# Altium footprint library IntLib.PcbLib: 221 footprints (part 13 of 14)
Each footprint in its own frame and in the unit in brackets; x right, y up, seen from the top. Pads: shape width x height; smd on the part's side, far side on the other; paste and mask are expansions set on the pad; w line width, h text height; cw(c..) or ccw(c..) is an arc to the next point about the centre after c.
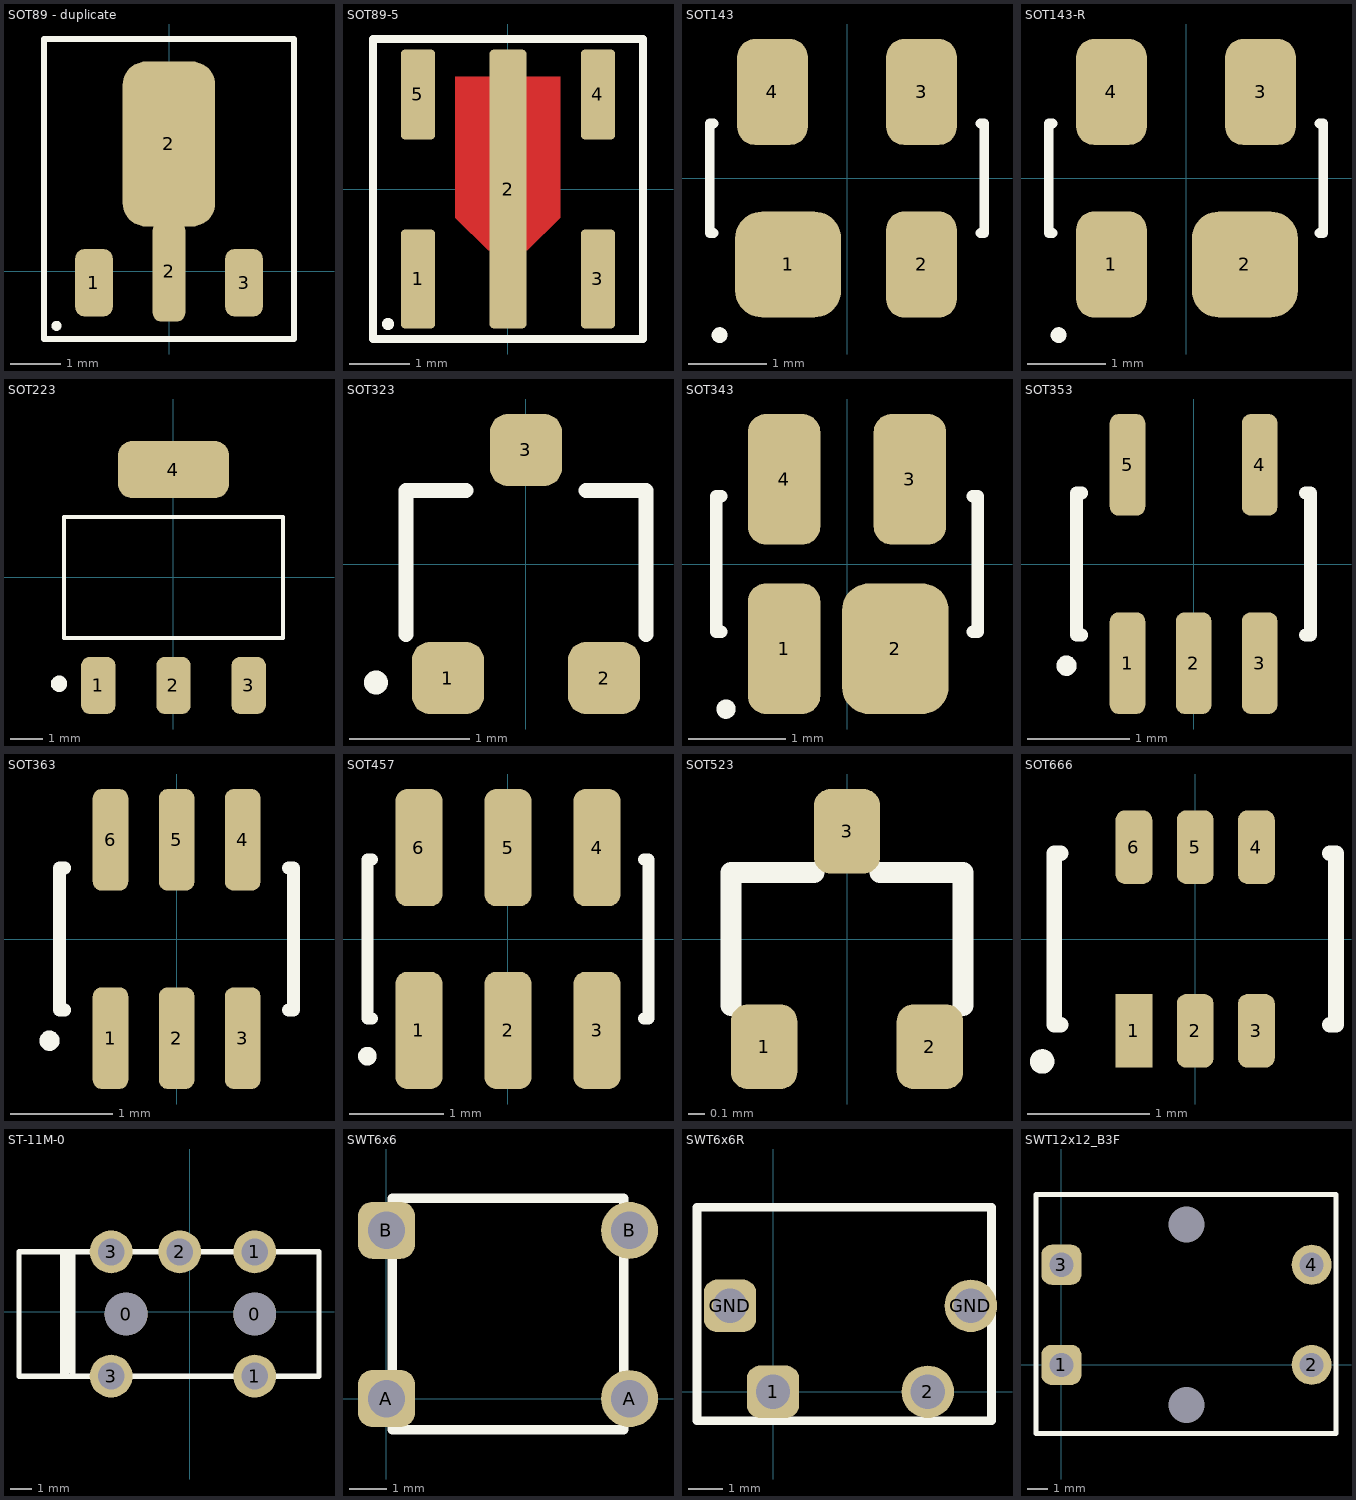
[diagram p12: the footprints below, top view; thin cyan lines are the x and y axes]

## SOT89 - duplicate [mm] "SC-62"
pads (4):
  rrect50% 0.75x1.35 smd: 1(-1.5,-0.225) 3(1.5,-0.225)
  rrect50% 1.85x3.3 smd: 2(0,2.55)
  rrect50% 0.65x2 smd: 2(0,0)
Top Overlay:
  circle w0.1: c-2.25,-1.088 r0.05
  lines w0.127: -2.5,-1.35 2.5,-1.35 2.5,4.65 -2.5,4.65 -2.5,-1.35
3D body: height 1.5, standoff 0, extent -2.25,-0.27 2.25,3.825

## SOT89-5 [mm] "SC-62"
pads (5):
  rrect25% 0.57x1.65 smd: 1(-1.5,-1.5) 3(1.5,-1.5)
  rrect25% 0.62x4.65 smd: 2(0,0)
  rrect25% 0.57x1.5 smd: 4(1.5,1.575) 5(-1.5,1.575)
Top Layer:
  region: -0.325,-1.025 -0.875,-0.475 -0.875,1.875 0.875,1.875 0.875,-0.475 0.325,-1.025
Top Overlay:
  circle w0.1: c-2,-2.25 r0.05
  lines w0.127: -2.25,-2.5 -2.25,2.5 2.25,2.5 2.25,-2.5 -2.25,-2.5
3D body: height 1.5, standoff 0, extent -2.25,-2.175 2.25,2.175

## SOT143 [mm] "SOT-143; 4 Leads; Body 3 x 2.6 mm, inc. leads (LxW max)"
height 1.1
pads (4):
  rrect50% 1.35x1.35 smd: 1(-0.75,-1.1)
  rrect50% 0.9x1.35 smd: 2(0.95,-1.1) 3(0.95,1.1) 4(-0.95,1.1)
Top Overlay:
  circle w0.1: c-1.625,-2 r0.05
  lines w0.127: -1.7,-0.7 -1.75,-0.7 -1.75,0.7 -1.7,0.7 ; 1.7,-0.7 1.75,-0.7 1.75,0.7 1.7,0.7
3D body: height 1.08, standoff -0.02, extent -1.501,-1.25 1.499,1.25

## SOT143-R [mm] "SOT-143; 4 Leads; Body 3 x 2.6 mm, inc. leads (LxW max)"
height 1.1
pads (4):
  rrect50% 0.9x1.35 smd: 1(-0.95,-1.1) 3(0.95,1.1) 4(-0.95,1.1)
  rrect50% 1.35x1.35 smd: 2(0.75,-1.1)
Top Overlay:
  circle w0.1: c-1.625,-2 r0.05
  lines w0.127: -1.7,-0.7 -1.75,-0.7 -1.75,0.7 -1.7,0.7 ; 1.7,-0.7 1.75,-0.7 1.75,0.7 1.7,0.7
3D body: height 1.08, standoff -0.02, extent -1.5,-1.25 1.5,1.25

## SOT223 [mm] "SOT-223/SC-73; 4 Leads; Body 6.7 x 7.3 mm, inc. leads (LxW max)"
height 1.8
pads (4):
  rrect50% 1.05x1.75 smd: 1(-2.3,-3.3) 2(0,-3.3) 3(2.3,-3.3)
  rrect50% 3.4x1.75 smd: 4(0,3.3)
Top Overlay:
  circle w0.25: c-3.5,-3.25 r0.125
  lines w0.127: -3.35,-1.85 -3.35,1.85 3.35,1.85 3.35,-1.85 -3.35,-1.85
3D body: height 1.64, standoff -0.01, extent -3.25,-3.5 3.25,3.5

## SOT323 [mm] "SOT-323/SC-70; 3 Leads; Body 2.2 x 2.2 mm, inc. leads (LxW max)"
height 1
pads (3):
  rrect50% 0.6x0.6 smd: 1(-0.65,-0.95) 2(0.65,-0.95) 3(0,0.95)
Top Overlay:
  circle w0.1: c-1.25,-0.987 r0.05
  lines w0.127: -1,-0.587 -1,0.613 -0.5,0.613 ; 0.5,0.613 1,0.613 1,-0.587
3D body: height 0.9, standoff 0, extent -1.05,-1.037 1.05,1.063

## SOT343 [mm] "SOT-343; 4 Leads; Body 2.2 x 2.2 mm, inc. leads (LxW max)"
height 1
pads (4):
  rrect50% 0.75x1.35 smd: 1(-0.65,-0.875) 3(0.65,0.875) 4(-0.65,0.875)
  rrect50% 1.1x1.35 smd: 2(0.5,-0.875)
Top Overlay:
  circle w0.1: c-1.25,-1.5 r0.05
  lines w0.127: -1.3,-0.7 -1.35,-0.7 -1.35,0.7 -1.3,0.7 ; 1.3,-0.7 1.35,-0.7 1.35,0.7 1.3,0.7
3D body: height 1, standoff 0, extent -1.1,-1.1 1.1,1.1

## SOT353 [mm] "SOT-353/SC-88A; 5 Leads; Body 2.2 x 2.2 mm, inc. leads (LxW max)"
height 1
pads (5):
  rrect50% 0.35x1 smd: 1(-0.65,-0.975) 2(0,-0.975) 3(0.65,-0.975) 4(0.65,0.975) 5(-0.65,0.975)
Top Overlay:
  circle w0.1: c-1.25,-1 r0.05
  lines w0.127: -1.1,-0.7 -1.15,-0.7 -1.15,0.7 -1.1,0.7 ; 1.1,-0.7 1.15,-0.7 1.15,0.7 1.1,0.7
3D body: height 1, standoff 0, extent -1.05,-1.15 1.05,1.15

## SOT363 [mm] "SOT-363/SC-88; 6 Leads; Body 2.2 x 2.2 mm, inc. leads (LxW max)"
height 1
pads (6):
  rrect50% 0.35x1 smd: 1(-0.65,-0.975) 2(0,-0.975) 3(0.65,-0.975) 4(0.65,0.975) 5(0,0.975) 6(-0.65,0.975)
Top Overlay:
  circle w0.1: c-1.25,-1 r0.05
  lines w0.127: -1.1,-0.7 -1.15,-0.7 -1.15,0.7 -1.1,0.7 ; 1.1,-0.7 1.15,-0.7 1.15,0.7 1.1,0.7
3D body: height 0.95, standoff -0.04, extent -1,-1.05 1,1.05

## SOT457 [mm] "SOT-457/SC-74; 6 Leads; Body 3.1 x 2.6 mm, inc. leads (LxW max)"
height 1.1
pads (6):
  rrect50% 0.5x1.25 smd: 1(-0.95,-0.975) 2(0,-0.975) 3(0.95,-0.975) 4(0.95,0.975) 5(0,0.975) 6(-0.95,0.975)
Top Overlay:
  circle w0.1: c-1.5,-1.25 r0.05
  lines w0.127: -1.45,-0.85 -1.5,-0.85 -1.5,0.85 -1.45,0.85 ; 1.45,-0.85 1.5,-0.85 1.5,0.85 1.45,0.85
3D body: height 0.94, standoff -0.09, extent -1.5,-1.385 1.5,1.386

## SOT523 [mm] "SOT-323/SC-70; 3 Leads; Body 2.2 x 2.2 mm, inc. leads (LxW max)"
height 1
pads (3):
  rrect50% 0.4x0.51 smd: 1(-0.5,-0.65) 2(0.5,-0.65) 3(0,0.65)
Top Overlay:
  lines w0.127: -0.7,-0.4 -0.7,0.4 -0.2,0.4 ; 0.2,0.4 0.7,0.4 0.7,-0.4
3D body: height 0.8, standoff 0, extent -0.8,-0.8 0.8,0.8

## SOT666 [mm] "SOT-6"
height 1
pads (6):
  rect 0.3x0.6 smd: 1(-0.5,-0.75)
  rrect50% 0.3x0.6 smd: 2(0,-0.75) 3(0.5,-0.75) 4(0.5,0.75) 5(0,0.75) 6(-0.5,0.75)
Top Overlay:
  circle w0.1: c-1.25,-1 r0.05
  lines w0.127: -1.1,-0.7 -1.15,-0.7 -1.15,0.7 -1.1,0.7 ; 1.1,-0.7 1.15,-0.7 1.15,0.7 1.1,0.7
3D body: height 0.6, standoff 0, extent -0.803,-0.8 0.787,0.8

## ST-11M-0 [mm]
pads (7):
  round 2 hole 2: 0(-2.967,-0.105) 0(3.033,-0.105)
  round 2 hole 1.25: 1(3.033,-3.005) 1(3.033,2.795) 2(-0.467,2.795) 3(-3.667,-3.005) 3(-3.667,2.795)
Top Overlay:
  lines w0.254: -5.917,2.77 -5.917,-3.005 -5.717,-2.805 -5.717,2.795 ; -5.467,-3.005 -5.467,2.795 ; -7.967,-3.005 6.033,-3.005 6.033,2.795 -7.967,2.795 -7.967,-3.005
3D body: height 6.5, standoff -1.5, extent -28.78,-3.962 5.92,4.038
3D body: height 5, standoff 0, extent -7.955,-2.54 -4.955,2.44
3D body: height 0, standoff -1, extent -3.835,-1 -2.042,0.797
3D body: height 5, standoff 0, extent -5.779,-2.972 6.198,2.795
3D body: height 0, standoff -1, extent 2.165,-1 3.957,0.797
3D body: height 5, standoff -1, extent 2.525,-3.259 3.541,-3.005
3D body: height 5, standoff -1, extent -4.175,-3.259 -3.159,-3.005
3D body: height 5, standoff -1, extent -4.175,2.795 -3.159,3.049
3D body: height 5, standoff -1, extent -0.975,2.795 0.041,3.049
3D body: height 5, standoff -1, extent 2.525,2.795 3.541,3.049
3D body: height 5, standoff 1, extent -1.092,-3.251 -0.076,-2.997

## SWT6x6 [mm]
pads (4):
  rrect50% 1.524x1.524 hole 1: A(0,0) B(0,4.5)
  round 1.524 hole 1: A(6.5,0) B(6.5,4.5)
Top Overlay:
  lines w0.254: 0.152,-0.838 6.352,-0.838 6.352,5.362 0.152,5.362 0.152,-0.838
3D body: height 8, standoff -4, extent -0.152,-0.813 6.648,5.387

## SWT6x6R [mm]
pads (4):
  rrect50% 1.524x1.524 hole 1: 1(0,0) GND(-1.25,2.5)
  round 1.524 hole 1: 2(4.5,0) GND(5.75,2.5)
Top Overlay:
  lines w0.254: -2.21,-0.838 -2.21,5.362 6.352,5.362 6.352,-0.838 -2.21,-0.838
3D body: height 7.4, standoff -3.6, extent -1.991,-5.811 6.614,4.039

## SWT12x12_B3F [mm]
pads (6):
  rrect50% 2x2 hole 1.2: 1(0,0) 3(0,5)
  round 2 hole 1.2: 2(12.5,0) 4(12.5,5)
  round 0 hole 1.8 unplated mask+1: ""(6.25,-2) ""(6.25,7)
Top Overlay:
  lines w0.254: -1.27,-3.429 -1.27,8.509 13.716,8.509 13.716,-3.429 -1.27,-3.429
3D body: height 4.3, standoff -3.5, extent -0.677,-3.491 13.123,8.509